# Altium footprint library Flight_controller v1.0.PcbLib: 98 footprints (part 2 of 7)
Each footprint in its own frame and in the unit in brackets; x right, y up, seen from the top. Pads: shape width x height; smd on the part's side, far side on the other; paste and mask are expansions set on the pad; w line width, h text height; cw(c..) or ccw(c..) is an arc to the next point about the centre after c.
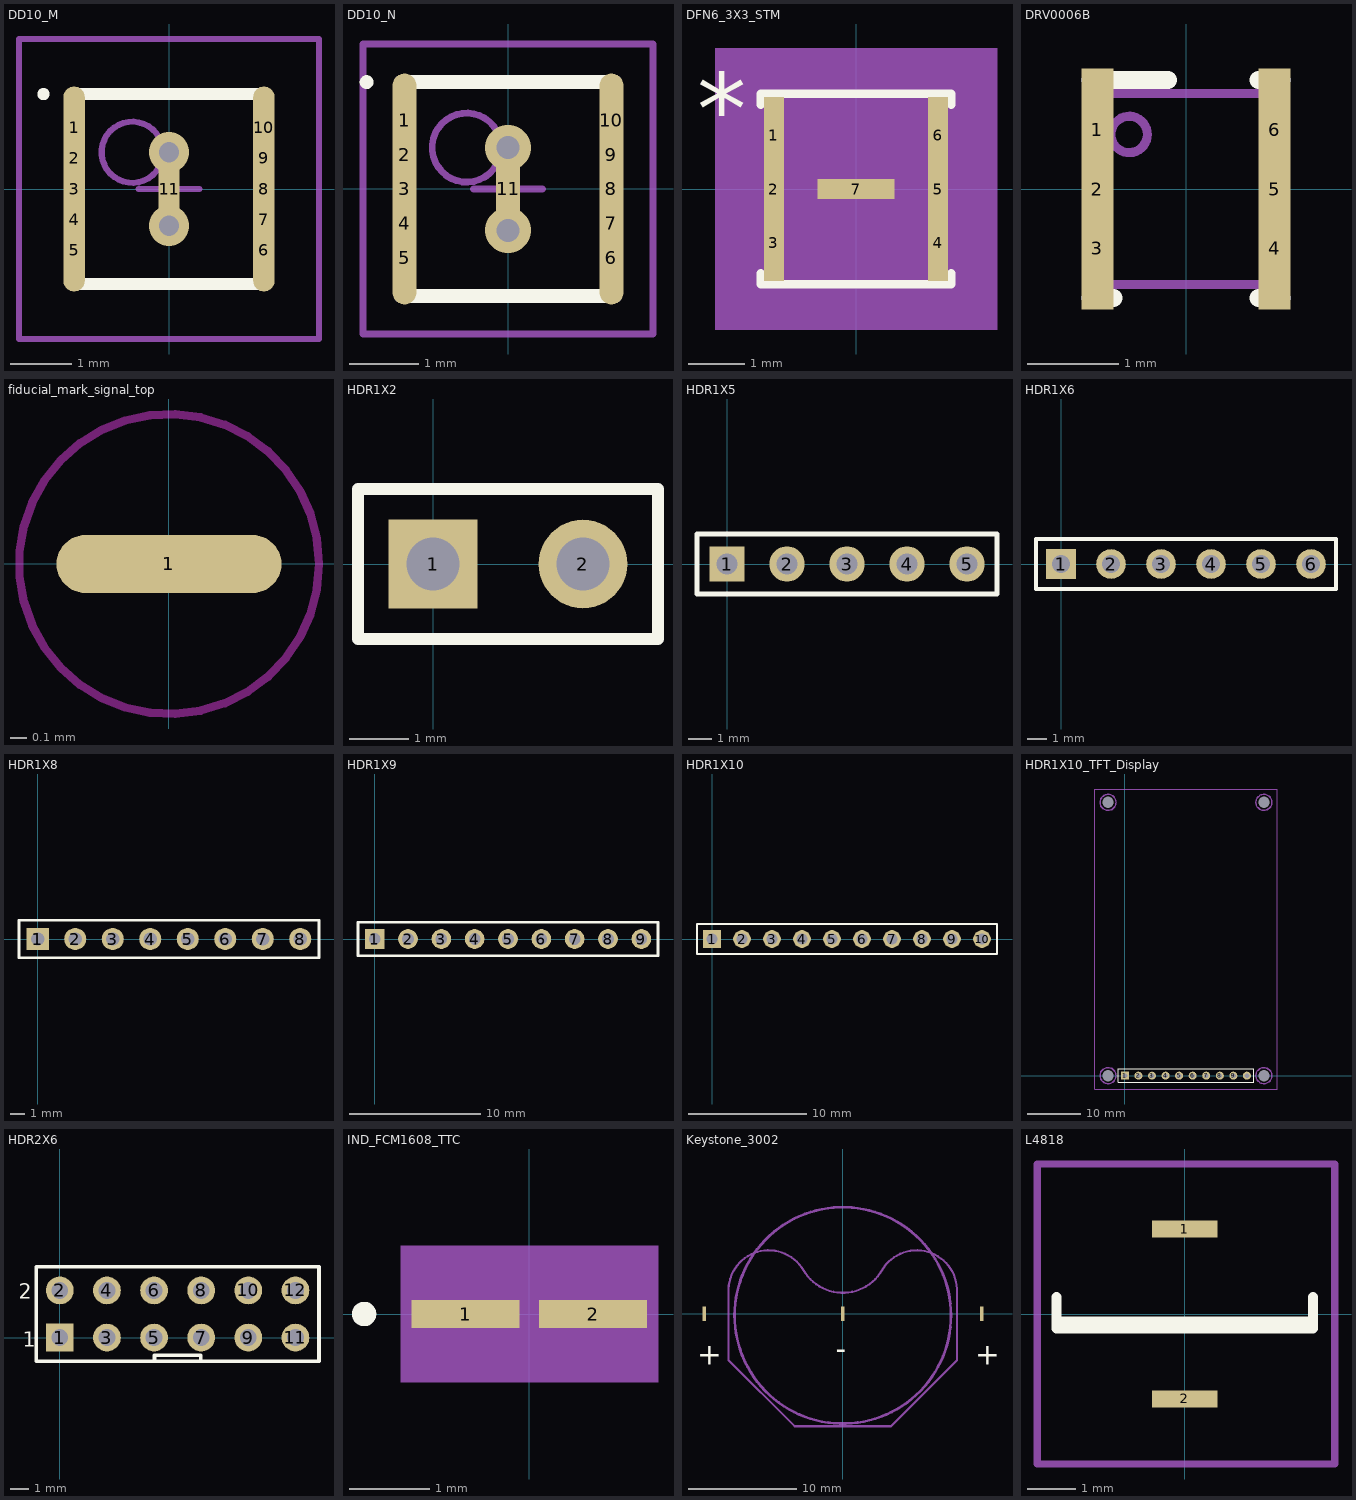
[diagram p1: the footprints below, top view; thin cyan lines are the x and y axes]

## DD10_M [mm] "SON, 10-Leads, Body 3x3 mm, Pitch 0.5mm, IPC Low Density"
height 0.8
pads (11):
  oval 0.35x1.35 smd paste+0.05 mask+0.05: 1(-1.55,1) 2(-1.55,0.5) 3(-1.55,0) 4(-1.55,-0.5) 5(-1.55,-1) 6(1.55,-1) 7(1.55,-0.5) 8(1.55,0) 9(1.55,0.5) 10(1.55,1)
  rect 0.35x1.35 smd paste+0.05 mask+0.05: 11(0,0)
via 0,-0.6 diameter 0.66 hole 0.33
via 0,0.6 diameter 0.66 hole 0.33
Top Overlay:
  circle w0.1: c-2.05,1.55 r0.05
  lines w0.2: -1.55,-1.525 -1.55,-1.55 1.55,-1.55 1.55,-1.525 ; -1.55,1.525 -1.55,1.55 1.55,1.55 1.55,1.525
Mechanical 13:
  circle w0.1: c-0.6,0.6 r0.5
  lines w0.1: -1.55,-1.55 -1.55,1.55 1.55,1.55 1.55,-1.55 -1.55,-1.55
Mechanical 15:
  lines w0.1: -0.5,0 0.5,0 ; 0,-0.5 0,0.5 ; -2.45,-2.45 -2.45,2.45 2.45,2.45 2.45,-2.45 -2.45,-2.45
3D body: height 0.8, standoff 0, extent -1.55,-1.55 1.55,1.55

## DD10_N [mm] "SON, 10-Leads, Body 3x3 mm, Pitch 0.5mm, IPC Medium Density"
height 0.8
pads (11):
  oval 0.35x1.35 smd paste+0.05 mask+0.05: 1(-1.5,1) 2(-1.5,0.5) 3(-1.5,0) 4(-1.5,-0.5) 5(-1.5,-1) 6(1.5,-1) 7(1.5,-0.5) 8(1.5,0) 9(1.5,0.5) 10(1.5,1)
  rect 0.35x1.35 smd paste+0.05 mask+0.05: 11(0,0)
via 0,0.6 diameter 0.66 hole 0.33
via 0,-0.6 diameter 0.66 hole 0.33
Top Overlay:
  circle w0.1: c-2.05,1.55 r0.05
  lines w0.2: -1.55,-1.525 -1.55,-1.55 1.55,-1.55 1.55,-1.525 ; -1.55,1.525 -1.55,1.55 1.55,1.55 1.55,1.525
Mechanical 13:
  circle w0.1: c-0.6,0.6 r0.5
  lines w0.1: -1.55,-1.55 1.55,-1.55 1.55,1.55 -1.55,1.55 -1.55,-1.55
Mechanical 15:
  lines w0.1: -0.5,0 0.5,0 ; 0,-0.5 0,0.5 ; -2.1,-2.1 2.1,-2.1 2.1,2.1 -2.1,2.1 -2.1,-2.1
3D body: height 0.8, standoff 0, extent -1.55,-1.55 1.55,1.55

## DFN6_3X3_STM [mm]
pads (7):
  rect 0.35x1.35 smd paste+0.05 mask+0.05: 1(-1.445,0.95) 2(-1.445,0) 3(-1.445,-0.95) 4(1.445,-0.95) 5(1.445,0) 6(1.445,0.95)
  rect 1.35x0.35 smd paste+0.05 mask+0.05: 7(0,0)
Top Overlay:
  lines w0.152: -1.676,-1.486 -1.676,-1.676 1.676,-1.676 1.676,-1.486 ; -1.676,1.486 -1.676,1.676 1.676,1.676 1.676,1.486
  text "*" at -2.802,0.79 h1.27
Mechanical 5:
  region: 2.484,-2.484 -2.484,-2.484 -2.484,2.484 2.484,2.484
Mechanical 13:
  lines w0.025: -1.549,0.279 -0.279,1.549 ; -1.549,-1.549 -1.549,1.549 1.549,1.549 1.549,-1.549 -1.549,-1.549 ; -1.549,-1.179 -1.549,-0.721 -1.549,-1.179 ; -1.549,-0.229 -1.549,0.229 -1.549,-0.229 ; -1.549,0.721 -1.549,1.179 -1.549,0.721 ; 1.549,-1.179 1.549,-0.721 1.549,-1.179 ; 1.549,-0.229 1.549,0.229 1.549,-0.229 ; 1.549,0.721 1.549,1.179 1.549,0.721
  text "*" at -1.359,0.79 h1.27
Mechanical 15:
  region: 0.017,-1.803 -1.803,-1.803 -1.803,-1.408 -2.103,-1.408 -2.103,1.408 -1.803,1.408 -1.803,1.803 0.017,1.803 0.017,2.103 -0.017,2.103 -0.017,1.803 1.803,1.803 1.803,1.408 2.103,1.408 2.103,-1.408 1.803,-1.408 1.803,-1.803 -0.017,-1.803 -0.017,-2.103 0.017,-2.103
  lines w0.152: -2.103,-1.408 -2.103,1.408 -1.803,1.408 -1.803,1.803 0.017,1.803 0.017,2.103 -0.017,2.103 -0.017,1.803 1.803,1.803 1.803,1.408 2.103,1.408 2.103,-1.408 1.803,-1.408 1.803,-1.803 -0.017,-1.803 -0.017,-2.103 0.017,-2.103 0.017,-1.803 -1.803,-1.803 -1.803,-1.408 -2.103,-1.408
3D body "DFN6_3X3_STM.step": height 0.99, standoff 0, extent -1.549,-1.549 1.549,1.549

## DRV0006B [mm]
pads (6):
  rect 0.35x1.35 smd paste+0.05 mask+0.05: 1(-0.975,0.65) 2(-0.975,0) 3(-0.975,-0.65) 4(0.975,-0.65) 5(0.975,0) 6(0.975,0.65)
Top Overlay:
  lines w0.2: -1.05,-1.2 -0.8,-1.2 ; -1.05,1.2 -0.2,1.2 ; 0.8,-1.2 1.05,-1.2 ; 0.8,1.2 1.05,1.2
Mechanical 13:
  circle w0.1: c-0.625,0.6 r0.2
  lines w0.1: -1.05,-1.05 -1.05,1.05 1.05,1.05 1.05,-1.05 -1.05,-1.05
  text ".Designator" at -0.9,-1.135 h1.27
3D body: height 0.25, standoff 0, extent 0,0 0.254,0.254
3D body "DRV0006A.stp": height 0.8, standoff 0, extent -1,-1 1,1

## fiducial_mark_signal_top [mm] "Fiducial mark for automatic assembly"
height 1
pads (1):
  oval 1.35x0.35 smd paste+0.05 mask+0.05: 1(0,0)
Top Layer keep-out:
  circle w0.05: c0,0 r0.9

## HDR1X2 [mm] "Connector; Header; 2 Position"
pads (2):
  rect 1.5x1.5 hole 0.9: 1(0,0)
  round 1.5 hole 0.9: 2(2.54,0)
Top Overlay:
  lines w0.2: -1.27,-1.27 3.81,-1.27 3.81,1.27 -1.27,1.27 -1.27,-1.27

## HDR1X5 [mm] "Connector; Header; 5 Position"
pads (5):
  rect 1.5x1.5 hole 0.9: 1(0,0)
  round 1.5 hole 0.9: 2(2.54,0) 3(5.08,0) 4(7.62,0) 5(10.16,0)
Top Overlay:
  lines w0.2: -1.27,-1.27 -1.27,1.27 11.43,1.27 11.43,-1.27 -1.27,-1.27

## HDR1X6 [mm] "Connector; Header; 6 Position"
pads (6):
  rect 1.5x1.5 hole 0.9: 1(0,0)
  round 1.5 hole 0.9: 2(2.54,0) 3(5.08,0) 4(7.62,0) 5(10.16,0) 6(12.7,0)
Top Overlay:
  lines w0.2: -1.27,-1.27 13.97,-1.27 13.97,1.27 -1.27,1.27 -1.27,-1.27

## HDR1X8 [mm] "Connector; Header; 8 Position"
pads (8):
  rect 1.5x1.5 hole 0.9: 1(0,0)
  round 1.5 hole 0.9: 2(2.54,0) 3(5.08,0) 4(7.62,0) 5(10.16,0) 6(12.7,0) 7(15.24,0) 8(17.78,0)
Top Overlay:
  lines w0.2: -1.27,-1.27 19.05,-1.27 19.05,1.27 -1.27,1.27 -1.27,-1.27

## HDR1X9 [mm] "Connector; Header; 9 Position"
pads (9):
  rect 1.5x1.5 hole 0.9: 1(0,0)
  round 1.5 hole 0.9: 2(2.54,0) 3(5.08,0) 4(7.62,0) 5(10.16,0) 6(12.7,0) 7(15.24,0) 8(17.78,0) 9(20.32,0)
Top Overlay:
  lines w0.2: -1.27,-1.27 -1.27,1.27 21.59,1.27 21.59,-1.27 -1.27,-1.27

## HDR1X10 [mm] "Connector; Header; 10 Position"
pads (10):
  rect 1.5x1.5 hole 0.9: 1(0,0)
  round 1.5 hole 0.9: 2(2.54,0) 3(5.08,0) 4(7.62,0) 5(10.16,0) 6(12.7,0) 7(15.24,0) 8(17.78,0) 9(20.32,0) 10(22.86,0)
Top Overlay:
  lines w0.2: -1.27,-1.27 24.13,-1.27 24.13,1.27 0.635,1.27 -1.27,1.27 -1.27,-1.27

## HDR1X10_TFT_Display [mm] "Connector; Header; 10 Position; Adafruit TFT Display"
pads (14):
  round 0 hole 2.1 unplated: 0(-3.15,51.2) 0(-3.15,0) 0(26.05,51.2) 0(26.05,0)
  rect 1.5x1.5 hole 0.9: 1(0,0)
  round 1.5 hole 0.9: 2(2.54,0) 3(5.08,0) 4(7.62,0) 5(10.16,0) 6(12.7,0) 7(15.24,0) 8(17.78,0) 9(20.32,0) 10(22.86,0)
Top Overlay:
  lines w0.2: -1.27,-1.27 -1.27,1.27 0.635,1.27 24.13,1.27 24.13,-1.27 -1.27,-1.27
Mechanical 15:
  circle w0.254: c26.05,51.2 r1.5
  circle w0.254: c26.05,0 r1.5
  circle w0.254: c-3.15,0 r1.5
  circle w0.254: c-3.15,51.2 r1.5
  lines w0.2: -4.15,0 -2.15,0 ; -4.15,51.2 -2.15,51.2 ; -3.15,-1 -3.15,1 ; -3.15,50.2 -3.15,52.2 ; 25.05,0 27.05,0 ; 25.05,51.2 27.05,51.2 ; 26.05,-1 26.05,1 ; 26.05,50.2 26.05,52.2 ; -5.65,-2.5 28.55,-2.5 28.55,53.7 -5.65,53.7 -5.65,-2.5

## HDR2X6 [mm] "Connector; Header; 6x2 Position"
pads (12):
  rect 1.5x1.5 hole 0.9: 1(0,0)
  round 1.5 hole 0.9: 2(0,2.54) 3(2.54,0) 4(2.54,2.54) 5(5.08,0) 6(5.08,2.54) 7(7.62,0) 8(7.62,2.54) 9(10.16,0) 10(10.16,2.54) 11(12.7,0) 12(12.7,2.54)
Top Overlay:
  lines w0.2: 5.1,-1.27 5.1,-0.95 7.6,-0.95 7.6,-1.27 ; -1.27,-1.27 -1.27,3.81 13.97,3.81 13.97,-1.27 -1.27,-1.27
  text "2" at -2.2,2.1 h0.8
  text "1" at -2,-0.5 h0.8

## IND_FCM1608_TTC [mm]
pads (2):
  rect 1.35x0.35 smd paste+0.05 mask+0.05: 1(-0.797,0) 2(0.797,0)
Top Overlay:
  circle w0.152: c-2.064,0 r0.076
Mechanical 5:
  region: 1.607,-0.851 -1.607,-0.851 -1.607,0.851 1.607,0.851
Mechanical 13:
  circle w0: c-0.67,0 r0.076
  lines w0.025: -0.876,-0.47 -0.876,0.47 ; -0.876,-0.47 0.876,-0.47 ; -0.876,-0.47 -0.368,-0.47 -0.368,0.47 -0.876,0.47 ; -0.876,-0.47 -0.876,0.47 ; -0.876,0.47 0.876,0.47 ; 0.876,-0.47 0.876,0.47 ; 0.876,-0.47 0.876,0.47 ; 0.876,-0.47 0.368,-0.47 0.368,0.47 0.876,0.47
Mechanical 15:
  region: 1.48,-0.724 -1.48,-0.724 -1.48,0.724 1.48,0.724
  lines w0.152: -1.48,-0.724 1.48,-0.724 1.48,0.724 -1.48,0.724 -1.48,-0.724
3D body "IND_FCM1608_TTC.step": height 0.94, standoff 0, extent -0.876,-0.47 0.876,0.47

## Keystone_3002 [mm] "Keystone 3002 Battery Holder - CR2032 or other 20mm diam. battery"
height 3
pads (3):
  rect 0.35x1.35 smd paste+0.05 mask+0.05: 1(-12.8,0) 1(12.85,0) 2(0,0)
Top Overlay:
  text "-" at -0.65,-4.2 h2
  text "+" at 12.25,-4.7 h2
  text "+" at -13.45,-4.7 h2
Mechanical 15:
  circle w0.254: c0,-0.15 r10.002
  lines w0.2: -10.568,-4.282 -4.45,-10.4 4.45,-10.4 10.55,-4.3 10.55,2.3 ccw(c6.832,2.147) 3.62,4.025 ; -10.568,-4.282 -10.568,2.235 -10.568,2.303 cw(c-6.85,2.15) -3.638,4.028 ccw(c0,6.15) 3.637,4.028

## L4818 [mm] "L4818"
height 5
pads (2):
  rect 1.35x0.35 smd paste+0.05 mask+0.05: 1(0,1.753) 2(0,-1.753)
Top Overlay:
  lines w0.2: -2.65,-0.025 -2.65,-0.15 2.65,-0.15 ; -2.65,0.35 -2.65,-0.3 2.65,-0.3 2.65,0.35
Mechanical 15:
  lines w0.15: -3.05,-3.1 3.1,-3.1
  lines w0.152: -3.05,-3.1 -3.05,3.1 3.1,3.1 3.1,-3.1